# Altium footprint library CONN_B2B_FMC.PcbLib: 12 footprints (part 2 of 2)
Each footprint in its own frame and in the unit in brackets; x right, y up, seen from the top. Pads: shape width x height; smd on the part's side, far side on the other; paste and mask are expansions set on the pad; w line width, h text height; cw(c..) or ccw(c..) is an arc to the next point about the centre after c.
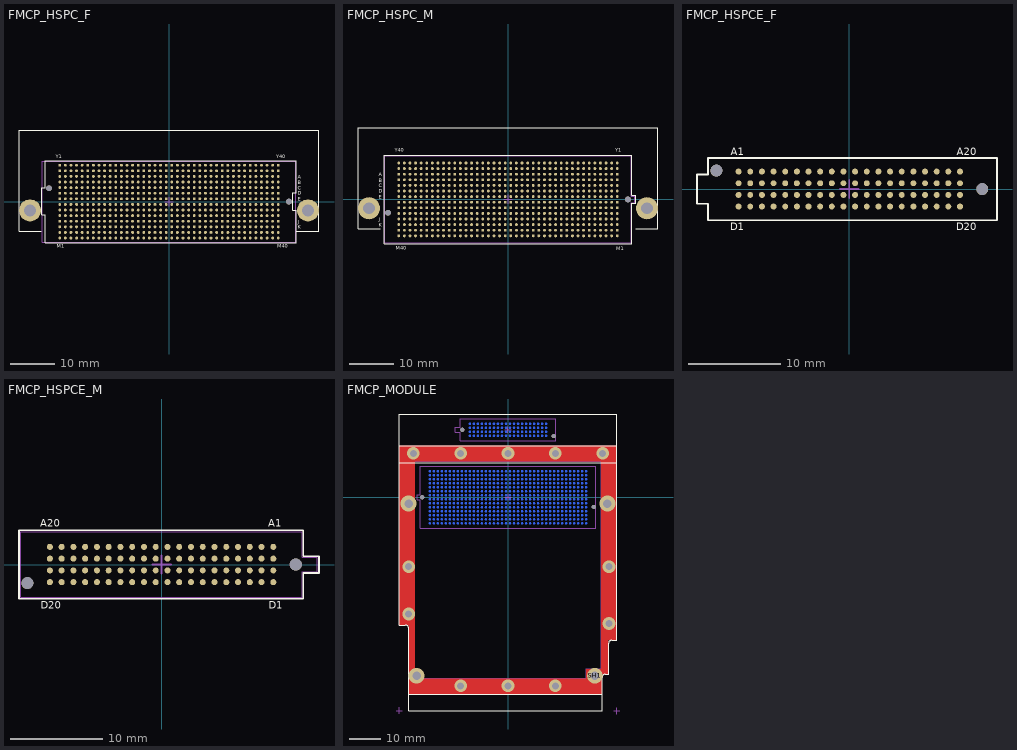
[diagram p1: the footprints below, top view; thin cyan lines are the x and y axes]

## FMCP_HSPC_F [mm] "FMC+ Carrier HSPC female, asp-184329"
height 10
pads (564):
  round 0.65 smd mask+0.075: A1(-24.765,5.715) A2(-23.495,5.715) A3(-22.225,5.715) A4(-20.955,5.715) A5(-19.685,5.715) A6(-18.415,5.715) A7(-17.145,5.715) A8(-15.875,5.715) A9(-14.605,5.715) A10(-13.335,5.715) A11(-12.065,5.715) A12(-10.795,5.715) A13(-9.525,5.715) A14(-8.255,5.715) A15(-6.985,5.715) A16(-5.715,5.715) A17(-4.445,5.715) A18(-3.175,5.715) A19(-1.905,5.715) A20(-0.635,5.715) A21(0.635,5.715) A22(1.905,5.715) A23(3.175,5.715) A24(4.445,5.715) A25(5.715,5.715) A26(6.985,5.715) A27(8.255,5.715) A28(9.525,5.715) A29(10.795,5.715) A30(12.065,5.715) A31(13.335,5.715) A32(14.605,5.715) A33(15.875,5.715) A34(17.145,5.715) A35(18.415,5.715) A36(19.685,5.715) A37(20.955,5.715) A38(22.225,5.715) A39(23.495,5.715) A40(24.765,5.715) B1(-24.765,4.445) B2(-23.495,4.445) B3(-22.225,4.445) B4(-20.955,4.445) B5(-19.685,4.445) B6(-18.415,4.445) B7(-17.145,4.445) B8(-15.875,4.445) B9(-14.605,4.445) B10(-13.335,4.445) B11(-12.065,4.445) B12(-10.795,4.445) B13(-9.525,4.445) B14(-8.255,4.445) B15(-6.985,4.445) B16(-5.715,4.445) B17(-4.445,4.445) B18(-3.175,4.445) B19(-1.905,4.445) B20(-0.635,4.445) B21(0.635,4.445) B22(1.905,4.445) B23(3.175,4.445) B24(4.445,4.445) B25(5.715,4.445) B26(6.985,4.445) B27(8.255,4.445) B28(9.525,4.445) B29(10.795,4.445) B30(12.065,4.445) B31(13.335,4.445) B32(14.605,4.445) B33(15.875,4.445) B34(17.145,4.445) B35(18.415,4.445) B36(19.685,4.445) B37(20.955,4.445) B38(22.225,4.445) B39(23.495,4.445) B40(24.765,4.445) C1(-24.765,3.175) C2(-23.495,3.175) C3(-22.225,3.175) C4(-20.955,3.175) C5(-19.685,3.175) C6(-18.415,3.175) C7(-17.145,3.175) C8(-15.875,3.175) C9(-14.605,3.175) C10(-13.335,3.175) C11(-12.065,3.175) C12(-10.795,3.175) C13(-9.525,3.175) C14(-8.255,3.175) C15(-6.985,3.175) C16(-5.715,3.175) C17(-4.445,3.175) C18(-3.175,3.175) C19(-1.905,3.175) C20(-0.635,3.175) C21(0.635,3.175) C22(1.905,3.175) C23(3.175,3.175) C24(4.445,3.175) C25(5.715,3.175) C26(6.985,3.175) C27(8.255,3.175) C28(9.525,3.175) C29(10.795,3.175) C30(12.065,3.175) C31(13.335,3.175) C32(14.605,3.175) C33(15.875,3.175) C34(17.145,3.175) C35(18.415,3.175) C36(19.685,3.175) C37(20.955,3.175) C38(22.225,3.175) C39(23.495,3.175) C40(24.765,3.175) D1(-24.765,1.905) D2(-23.495,1.905) D3(-22.225,1.905) D4(-20.955,1.905) D5(-19.685,1.905) D6(-18.415,1.905) D7(-17.145,1.905) D8(-15.875,1.905) D9(-14.605,1.905) D10(-13.335,1.905) D11(-12.065,1.905) D12(-10.795,1.905) D13(-9.525,1.905) D14(-8.255,1.905) D15(-6.985,1.905) D16(-5.715,1.905) D17(-4.445,1.905) D18(-3.175,1.905) D19(-1.905,1.905) D20(-0.635,1.905) D21(0.635,1.905) D22(1.905,1.905) D23(3.175,1.905) D24(4.445,1.905) D25(5.715,1.905) D26(6.985,1.905) D27(8.255,1.905) D28(9.525,1.905) D29(10.795,1.905) D30(12.065,1.905) D31(13.335,1.905) D32(14.605,1.905) D33(15.875,1.905) D34(17.145,1.905) D35(18.415,1.905) D36(19.685,1.905) D37(20.955,1.905) D38(22.225,1.905) D39(23.495,1.905) D40(24.765,1.905) E1(-24.765,0.635) E2(-23.495,0.635) E3(-22.225,0.635) E4(-20.955,0.635) E5(-19.685,0.635) E6(-18.415,0.635) E7(-17.145,0.635) E8(-15.875,0.635) E9(-14.605,0.635) E10(-13.335,0.635) E11(-12.065,0.635) E12(-10.795,0.635) E13(-9.525,0.635) E14(-8.255,0.635) E15(-6.985,0.635) E16(-5.715,0.635) E17(-4.445,0.635) E18(-3.175,0.635) E19(-1.905,0.635) E20(-0.635,0.635) E21(0.635,0.635) E22(1.905,0.635) E23(3.175,0.635) E24(4.445,0.635) E25(5.715,0.635) E26(6.985,0.635) E27(8.255,0.635) E28(9.525,0.635) E29(10.795,0.635) E30(12.065,0.635) E31(13.335,0.635) E32(14.605,0.635) E33(15.875,0.635) E34(17.145,0.635) E35(18.415,0.635) E36(19.685,0.635) E37(20.955,0.635) E38(22.225,0.635) E39(23.495,0.635) E40(24.765,0.635) F1(-24.765,-0.635) F2(-23.495,-0.635) F3(-22.225,-0.635) F4(-20.955,-0.635) F5(-19.685,-0.635) F6(-18.415,-0.635) F7(-17.145,-0.635) F8(-15.875,-0.635) F9(-14.605,-0.635) F10(-13.335,-0.635) F11(-12.065,-0.635) F12(-10.795,-0.635) F13(-9.525,-0.635) F14(-8.255,-0.635) F15(-6.985,-0.635) F16(-5.715,-0.635) F17(-4.445,-0.635) F18(-3.175,-0.635) F19(-1.905,-0.635) F20(-0.635,-0.635) F21(0.635,-0.635) F22(1.905,-0.635) F23(3.175,-0.635) F24(4.445,-0.635) F25(5.715,-0.635) F26(6.985,-0.635) F27(8.255,-0.635) F28(9.525,-0.635) F29(10.795,-0.635) F30(12.065,-0.635) F31(13.335,-0.635) F32(14.605,-0.635) F33(15.875,-0.635) F34(17.145,-0.635) F35(18.415,-0.635) F36(19.685,-0.635) F37(20.955,-0.635) F38(22.225,-0.635) F39(23.495,-0.635) F40(24.765,-0.635) G1(-24.765,-1.905) G2(-23.495,-1.905) G3(-22.225,-1.905) G4(-20.955,-1.905) G5(-19.685,-1.905) G6(-18.415,-1.905) G7(-17.145,-1.905) G8(-15.875,-1.905) G9(-14.605,-1.905) G10(-13.335,-1.905) G11(-12.065,-1.905) G12(-10.795,-1.905) G13(-9.525,-1.905) G14(-8.255,-1.905) G15(-6.985,-1.905) G16(-5.715,-1.905) G17(-4.445,-1.905) G18(-3.175,-1.905) G19(-1.905,-1.905) G20(-0.635,-1.905) G21(0.635,-1.905) G22(1.905,-1.905) G23(3.175,-1.905) G24(4.445,-1.905) G25(5.715,-1.905) G26(6.985,-1.905) G27(8.255,-1.905) G28(9.525,-1.905) G29(10.795,-1.905) G30(12.065,-1.905) G31(13.335,-1.905) G32(14.605,-1.905) G33(15.875,-1.905) G34(17.145,-1.905) G35(18.415,-1.905) G36(19.685,-1.905) G37(20.955,-1.905) G38(22.225,-1.905) G39(23.495,-1.905) G40(24.765,-1.905) H1(-24.765,-3.175) H2(-23.495,-3.175) H3(-22.225,-3.175) H4(-20.955,-3.175) H5(-19.685,-3.175) H6(-18.415,-3.175) H7(-17.145,-3.175) H8(-15.875,-3.175) H9(-14.605,-3.175) H10(-13.335,-3.175) H11(-12.065,-3.175) H12(-10.795,-3.175) H13(-9.525,-3.175) H14(-8.255,-3.175) H15(-6.985,-3.175) H16(-5.715,-3.175) H17(-4.445,-3.175) H18(-3.175,-3.175) H19(-1.905,-3.175) H20(-0.635,-3.175) H21(0.635,-3.175) H22(1.905,-3.175) H23(3.175,-3.175) H24(4.445,-3.175) H25(5.715,-3.175) H26(6.985,-3.175) H27(8.255,-3.175) H28(9.525,-3.175) H29(10.795,-3.175) H30(12.065,-3.175) H31(13.335,-3.175) H32(14.605,-3.175) H33(15.875,-3.175) H34(17.145,-3.175) H35(18.415,-3.175) H36(19.685,-3.175) H37(20.955,-3.175) H38(22.225,-3.175) H39(23.495,-3.175) H40(24.765,-3.175) J1(-24.765,-4.445) J2(-23.495,-4.445) J3(-22.225,-4.445) J4(-20.955,-4.445) J5(-19.685,-4.445) J6(-18.415,-4.445) J7(-17.145,-4.445) J8(-15.875,-4.445) J9(-14.605,-4.445) J10(-13.335,-4.445) J11(-12.065,-4.445) J12(-10.795,-4.445) J13(-9.525,-4.445) J14(-8.255,-4.445) J15(-6.985,-4.445) J16(-5.715,-4.445) J17(-4.445,-4.445) J18(-3.175,-4.445) J19(-1.905,-4.445) J20(-0.635,-4.445) J21(0.635,-4.445) J22(1.905,-4.445) J23(3.175,-4.445) J24(4.445,-4.445) J25(5.715,-4.445) J26(6.985,-4.445) J27(8.255,-4.445) J28(9.525,-4.445) J29(10.795,-4.445) J30(12.065,-4.445) J31(13.335,-4.445) J32(14.605,-4.445) J33(15.875,-4.445) J34(17.145,-4.445) J35(18.415,-4.445) J36(19.685,-4.445) J37(20.955,-4.445) J38(22.225,-4.445) J39(23.495,-4.445) J40(24.765,-4.445) K1(-24.765,-5.715) K2(-23.495,-5.715) K3(-22.225,-5.715) K4(-20.955,-5.715) K5(-19.685,-5.715) K6(-18.415,-5.715) K7(-17.145,-5.715) K8(-15.875,-5.715) K9(-14.605,-5.715) K10(-13.335,-5.715) K11(-12.065,-5.715) K12(-10.795,-5.715) K13(-9.525,-5.715) K14(-8.255,-5.715) K15(-6.985,-5.715) K16(-5.715,-5.715) K17(-4.445,-5.715) K18(-3.175,-5.715) K19(-1.905,-5.715) K20(-0.635,-5.715) K21(0.635,-5.715) K22(1.905,-5.715) K23(3.175,-5.715) K24(4.445,-5.715) K25(5.715,-5.715) K26(6.985,-5.715) K27(8.255,-5.715) K28(9.525,-5.715) K29(10.795,-5.715) K30(12.065,-5.715) K31(13.335,-5.715) K32(14.605,-5.715) K33(15.875,-5.715) K34(17.145,-5.715) K35(18.415,-5.715) K36(19.685,-5.715) K37(20.955,-5.715) K38(22.225,-5.715) K39(23.495,-5.715) K40(24.765,-5.715) L1(-24.765,-6.985) L2(-23.495,-6.985) L3(-22.225,-6.985) L4(-20.955,-6.985) L5(-19.685,-6.985) L6(-18.415,-6.985) L7(-17.145,-6.985) L8(-15.875,-6.985) L9(-14.605,-6.985) L10(-13.335,-6.985) L11(-12.065,-6.985) L12(-10.795,-6.985) L13(-9.525,-6.985) L14(-8.255,-6.985) L15(-6.985,-6.985) L16(-5.715,-6.985) L17(-4.445,-6.985) L18(-3.175,-6.985) L19(-1.905,-6.985) L20(-0.635,-6.985) L21(0.635,-6.985) L22(1.905,-6.985) L23(3.175,-6.985) L24(4.445,-6.985) L25(5.715,-6.985) L26(6.985,-6.985) L27(8.255,-6.985) L28(9.525,-6.985) L29(10.795,-6.985) L30(12.065,-6.985) L31(13.335,-6.985) L32(14.605,-6.985) L33(15.875,-6.985) L34(17.145,-6.985) L35(18.415,-6.985) L36(19.685,-6.985) L37(20.955,-6.985) L38(22.225,-6.985) L39(23.495,-6.985) L40(24.765,-6.985) M1(-24.765,-8.255) M2(-23.495,-8.255) M3(-22.225,-8.255) M4(-20.955,-8.255) M5(-19.685,-8.255) M6(-18.415,-8.255) M7(-17.145,-8.255) M8(-15.875,-8.255) M9(-14.605,-8.255) M10(-13.335,-8.255) M11(-12.065,-8.255) M12(-10.795,-8.255) M13(-9.525,-8.255) M14(-8.255,-8.255) M15(-6.985,-8.255) M16(-5.715,-8.255) M17(-4.445,-8.255) M18(-3.175,-8.255) M19(-1.905,-8.255) M20(-0.635,-8.255) M21(0.635,-8.255) M22(1.905,-8.255) M23(3.175,-8.255) M24(4.445,-8.255) M25(5.715,-8.255) M26(6.985,-8.255) M27(8.255,-8.255) M28(9.525,-8.255) M29(10.795,-8.255) M30(12.065,-8.255) M31(13.335,-8.255) M32(14.605,-8.255) M33(15.875,-8.255) M34(17.145,-8.255) M35(18.415,-8.255) M36(19.685,-8.255) M37(20.955,-8.255) M38(22.225,-8.255) M39(23.495,-8.255) M40(24.765,-8.255) Y1(-24.765,8.255) Y2(-23.495,8.255) Y3(-22.225,8.255) Y4(-20.955,8.255) Y5(-19.685,8.255) Y6(-18.415,8.255) Y7(-17.145,8.255) Y8(-15.875,8.255) Y9(-14.605,8.255) Y10(-13.335,8.255) Y11(-12.065,8.255) Y12(-10.795,8.255) Y13(-9.525,8.255) Y14(-8.255,8.255) Y15(-6.985,8.255) Y16(-5.715,8.255) Y17(-4.445,8.255) Y18(-3.175,8.255) Y19(-1.905,8.255) Y20(-0.635,8.255) Y21(0.635,8.255) Y22(1.905,8.255) Y23(3.175,8.255) Y24(4.445,8.255) Y25(5.715,8.255) Y26(6.985,8.255) Y27(8.255,8.255) Y28(9.525,8.255) Y29(10.795,8.255) Y30(12.065,8.255) Y31(13.335,8.255) Y32(14.605,8.255) Y33(15.875,8.255) Y34(17.145,8.255) Y35(18.415,8.255) Y36(19.685,8.255) Y37(20.955,8.255) Y38(22.225,8.255) Y39(23.495,8.255) Y40(24.765,8.255) Z1(-24.765,6.985) Z2(-23.495,6.985) Z3(-22.225,6.985) Z4(-20.955,6.985) Z5(-19.685,6.985) Z6(-18.415,6.985) Z7(-17.145,6.985) Z8(-15.875,6.985) Z9(-14.605,6.985) Z10(-13.335,6.985) Z11(-12.065,6.985) Z12(-10.795,6.985) Z13(-9.525,6.985) Z14(-8.255,6.985) Z15(-6.985,6.985) Z16(-5.715,6.985) Z17(-4.445,6.985) Z18(-3.175,6.985) Z19(-1.905,6.985) Z20(-0.635,6.985) Z21(0.635,6.985) Z22(1.905,6.985) Z23(3.175,6.985) Z24(4.445,6.985) Z25(5.715,6.985) Z26(6.985,6.985) Z27(8.255,6.985) Z28(9.525,6.985) Z29(10.795,6.985) Z30(12.065,6.985) Z31(13.335,6.985) Z32(14.605,6.985) Z33(15.875,6.985) Z34(17.145,6.985) Z35(18.415,6.985) Z36(19.685,6.985) Z37(20.955,6.985) Z38(22.225,6.985) Z39(23.495,6.985) Z40(24.765,6.985)
  round 5 hole 2.7: ""(-31.5,-2) ""(31.5,-2)
  round 1.3 hole 1.3 unplated: ""(-27.191,3.048) ""(27.191,0)
Top Overlay:
  lines w0.2: -29,-6.7 -34,-6.7 -34,16.2 34,16.2 34,-6.7 29,-6.7 ; -28.8,-3 -28,-3 -28,-9.3 28.8,-9.3 28.8,-2 28,-2 28,2 28.8,2 28.8,9.3 -28,9.3 -28,3.1 -28.1,3.1 -28.8,3.1 -28.8,-3
  text "M40" at 24.552,-10.482 h0.8
  text "Y40" at 24.267,9.781 h0.8
  text "M1" at -25.489,-10.456 h0.8
  text "Y1" at -25.727,9.792 h0.8
  text "K" at 29.2,-6.2 h0.8
  text "J" at 29.2,-5 h0.8
  text "E" at 29.2,0.2 h0.8
  text "D" at 29.2,1.5 h0.8
  text "C" at 29.2,2.7 h0.8
  text "B" at 29.2,3.9 h0.8
  text "A" at 29.2,5.2 h0.8
Mechanical 1:
  lines w0.2: -1,0 1,0 ; 0,-1 0,1
Mechanical 15:
  lines w0.1: -28.7,-9.2 -28.7,9.2 28.7,9.2 28.7,-9.2 -28.7,-9.2
3D body "asp-184329-01_socket.step": height 6.48, standoff -1.35, extent -28.728,-9.184 28.727,9.183

## FMCP_HSPC_M [mm] "FMC+ Module HSPC male, asp-184330"
height 10
pads (564):
  round 0.65 smd mask+0.075: A1(24.765,5.715) A2(23.495,5.715) A3(22.225,5.715) A4(20.955,5.715) A5(19.685,5.715) A6(18.415,5.715) A7(17.145,5.715) A8(15.875,5.715) A9(14.605,5.715) A10(13.335,5.715) A11(12.065,5.715) A12(10.795,5.715) A13(9.525,5.715) A14(8.255,5.715) A15(6.985,5.715) A16(5.715,5.715) A17(4.445,5.715) A18(3.175,5.715) A19(1.905,5.715) A20(0.635,5.715) A21(-0.635,5.715) A22(-1.905,5.715) A23(-3.175,5.715) A24(-4.445,5.715) A25(-5.715,5.715) A26(-6.985,5.715) A27(-8.255,5.715) A28(-9.525,5.715) A29(-10.795,5.715) A30(-12.065,5.715) A31(-13.335,5.715) A32(-14.605,5.715) A33(-15.875,5.715) A34(-17.145,5.715) A35(-18.415,5.715) A36(-19.685,5.715) A37(-20.955,5.715) A38(-22.225,5.715) A39(-23.495,5.715) A40(-24.765,5.715) B1(24.765,4.445) B2(23.495,4.445) B3(22.225,4.445) B4(20.955,4.445) B5(19.685,4.445) B6(18.415,4.445) B7(17.145,4.445) B8(15.875,4.445) B9(14.605,4.445) B10(13.335,4.445) B11(12.065,4.445) B12(10.795,4.445) B13(9.525,4.445) B14(8.255,4.445) B15(6.985,4.445) B16(5.715,4.445) B17(4.445,4.445) B18(3.175,4.445) B19(1.905,4.445) B20(0.635,4.445) B21(-0.635,4.445) B22(-1.905,4.445) B23(-3.175,4.445) B24(-4.445,4.445) B25(-5.715,4.445) B26(-6.985,4.445) B27(-8.255,4.445) B28(-9.525,4.445) B29(-10.795,4.445) B30(-12.065,4.445) B31(-13.335,4.445) B32(-14.605,4.445) B33(-15.875,4.445) B34(-17.145,4.445) B35(-18.415,4.445) B36(-19.685,4.445) B37(-20.955,4.445) B38(-22.225,4.445) B39(-23.495,4.445) B40(-24.765,4.445) C1(24.765,3.175) C2(23.495,3.175) C3(22.225,3.175) C4(20.955,3.175) C5(19.685,3.175) C6(18.415,3.175) C7(17.145,3.175) C8(15.875,3.175) C9(14.605,3.175) C10(13.335,3.175) C11(12.065,3.175) C12(10.795,3.175) C13(9.525,3.175) C14(8.255,3.175) C15(6.985,3.175) C16(5.715,3.175) C17(4.445,3.175) C18(3.175,3.175) C19(1.905,3.175) C20(0.635,3.175) C21(-0.635,3.175) C22(-1.905,3.175) C23(-3.175,3.175) C24(-4.445,3.175) C25(-5.715,3.175) C26(-6.985,3.175) C27(-8.255,3.175) C28(-9.525,3.175) C29(-10.795,3.175) C30(-12.065,3.175) C31(-13.335,3.175) C32(-14.605,3.175) C33(-15.875,3.175) C34(-17.145,3.175) C35(-18.415,3.175) C36(-19.685,3.175) C37(-20.955,3.175) C38(-22.225,3.175) C39(-23.495,3.175) C40(-24.765,3.175) D1(24.765,1.905) D2(23.495,1.905) D3(22.225,1.905) D4(20.955,1.905) D5(19.685,1.905) D6(18.415,1.905) D7(17.145,1.905) D8(15.875,1.905) D9(14.605,1.905) D10(13.335,1.905) D11(12.065,1.905) D12(10.795,1.905) D13(9.525,1.905) D14(8.255,1.905) D15(6.985,1.905) D16(5.715,1.905) D17(4.445,1.905) D18(3.175,1.905) D19(1.905,1.905) D20(0.635,1.905) D21(-0.635,1.905) D22(-1.905,1.905) D23(-3.175,1.905) D24(-4.445,1.905) D25(-5.715,1.905) D26(-6.985,1.905) D27(-8.255,1.905) D28(-9.525,1.905) D29(-10.795,1.905) D30(-12.065,1.905) D31(-13.335,1.905) D32(-14.605,1.905) D33(-15.875,1.905) D34(-17.145,1.905) D35(-18.415,1.905) D36(-19.685,1.905) D37(-20.955,1.905) D38(-22.225,1.905) D39(-23.495,1.905) D40(-24.765,1.905) E1(24.765,0.635) E2(23.495,0.635) E3(22.225,0.635) E4(20.955,0.635) E5(19.685,0.635) E6(18.415,0.635) E7(17.145,0.635) E8(15.875,0.635) E9(14.605,0.635) E10(13.335,0.635) E11(12.065,0.635) E12(10.795,0.635) E13(9.525,0.635) E14(8.255,0.635) E15(6.985,0.635) E16(5.715,0.635) E17(4.445,0.635) E18(3.175,0.635) E19(1.905,0.635) E20(0.635,0.635) E21(-0.635,0.635) E22(-1.905,0.635) E23(-3.175,0.635) E24(-4.445,0.635) E25(-5.715,0.635) E26(-6.985,0.635) E27(-8.255,0.635) E28(-9.525,0.635) E29(-10.795,0.635) E30(-12.065,0.635) E31(-13.335,0.635) E32(-14.605,0.635) E33(-15.875,0.635) E34(-17.145,0.635) E35(-18.415,0.635) E36(-19.685,0.635) E37(-20.955,0.635) E38(-22.225,0.635) E39(-23.495,0.635) E40(-24.765,0.635) F1(24.765,-0.635) F2(23.495,-0.635) F3(22.225,-0.635) F4(20.955,-0.635) F5(19.685,-0.635) F6(18.415,-0.635) F7(17.145,-0.635) F8(15.875,-0.635) F9(14.605,-0.635) F10(13.335,-0.635) F11(12.065,-0.635) F12(10.795,-0.635) F13(9.525,-0.635) F14(8.255,-0.635) F15(6.985,-0.635) F16(5.715,-0.635) F17(4.445,-0.635) F18(3.175,-0.635) F19(1.905,-0.635) F20(0.635,-0.635) F21(-0.635,-0.635) F22(-1.905,-0.635) F23(-3.175,-0.635) F24(-4.445,-0.635) F25(-5.715,-0.635) F26(-6.985,-0.635) F27(-8.255,-0.635) F28(-9.525,-0.635) F29(-10.795,-0.635) F30(-12.065,-0.635) F31(-13.335,-0.635) F32(-14.605,-0.635) F33(-15.875,-0.635) F34(-17.145,-0.635) F35(-18.415,-0.635) F36(-19.685,-0.635) F37(-20.955,-0.635) F38(-22.225,-0.635) F39(-23.495,-0.635) F40(-24.765,-0.635) G1(24.765,-1.905) G2(23.495,-1.905) G3(22.225,-1.905) G4(20.955,-1.905) G5(19.685,-1.905) G6(18.415,-1.905) G7(17.145,-1.905) G8(15.875,-1.905) G9(14.605,-1.905) G10(13.335,-1.905) G11(12.065,-1.905) G12(10.795,-1.905) G13(9.525,-1.905) G14(8.255,-1.905) G15(6.985,-1.905) G16(5.715,-1.905) G17(4.445,-1.905) G18(3.175,-1.905) G19(1.905,-1.905) G20(0.635,-1.905) G21(-0.635,-1.905) G22(-1.905,-1.905) G23(-3.175,-1.905) G24(-4.445,-1.905) G25(-5.715,-1.905) G26(-6.985,-1.905) G27(-8.255,-1.905) G28(-9.525,-1.905) G29(-10.795,-1.905) G30(-12.065,-1.905) G31(-13.335,-1.905) G32(-14.605,-1.905) G33(-15.875,-1.905) G34(-17.145,-1.905) G35(-18.415,-1.905) G36(-19.685,-1.905) G37(-20.955,-1.905) G38(-22.225,-1.905) G39(-23.495,-1.905) G40(-24.765,-1.905) H1(24.765,-3.175) H2(23.495,-3.175) H3(22.225,-3.175) H4(20.955,-3.175) H5(19.685,-3.175) H6(18.415,-3.175) H7(17.145,-3.175) H8(15.875,-3.175) H9(14.605,-3.175) H10(13.335,-3.175) H11(12.065,-3.175) H12(10.795,-3.175) H13(9.525,-3.175) H14(8.255,-3.175) H15(6.985,-3.175) H16(5.715,-3.175) H17(4.445,-3.175) H18(3.175,-3.175) H19(1.905,-3.175) H20(0.635,-3.175) H21(-0.635,-3.175) H22(-1.905,-3.175) H23(-3.175,-3.175) H24(-4.445,-3.175) H25(-5.715,-3.175) H26(-6.985,-3.175) H27(-8.255,-3.175) H28(-9.525,-3.175) H29(-10.795,-3.175) H30(-12.065,-3.175) H31(-13.335,-3.175) H32(-14.605,-3.175) H33(-15.875,-3.175) H34(-17.145,-3.175) H35(-18.415,-3.175) H36(-19.685,-3.175) H37(-20.955,-3.175) H38(-22.225,-3.175) H39(-23.495,-3.175) H40(-24.765,-3.175) J1(24.765,-4.445) J2(23.495,-4.445) J3(22.225,-4.445) J4(20.955,-4.445) J5(19.685,-4.445) J6(18.415,-4.445) J7(17.145,-4.445) J8(15.875,-4.445) J9(14.605,-4.445) J10(13.335,-4.445) J11(12.065,-4.445) J12(10.795,-4.445) J13(9.525,-4.445) J14(8.255,-4.445) J15(6.985,-4.445) J16(5.715,-4.445) J17(4.445,-4.445) J18(3.175,-4.445) J19(1.905,-4.445) J20(0.635,-4.445) J21(-0.635,-4.445) J22(-1.905,-4.445) J23(-3.175,-4.445) J24(-4.445,-4.445) J25(-5.715,-4.445) J26(-6.985,-4.445) J27(-8.255,-4.445) J28(-9.525,-4.445) J29(-10.795,-4.445) J30(-12.065,-4.445) J31(-13.335,-4.445) J32(-14.605,-4.445) J33(-15.875,-4.445) J34(-17.145,-4.445) J35(-18.415,-4.445) J36(-19.685,-4.445) J37(-20.955,-4.445) J38(-22.225,-4.445) J39(-23.495,-4.445) J40(-24.765,-4.445) K1(24.765,-5.715) K2(23.495,-5.715) K3(22.225,-5.715) K4(20.955,-5.715) K5(19.685,-5.715) K6(18.415,-5.715) K7(17.145,-5.715) K8(15.875,-5.715) K9(14.605,-5.715) K10(13.335,-5.715) K11(12.065,-5.715) K12(10.795,-5.715) K13(9.525,-5.715) K14(8.255,-5.715) K15(6.985,-5.715) K16(5.715,-5.715) K17(4.445,-5.715) K18(3.175,-5.715) K19(1.905,-5.715) K20(0.635,-5.715) K21(-0.635,-5.715) K22(-1.905,-5.715) K23(-3.175,-5.715) K24(-4.445,-5.715) K25(-5.715,-5.715) K26(-6.985,-5.715) K27(-8.255,-5.715) K28(-9.525,-5.715) K29(-10.795,-5.715) K30(-12.065,-5.715) K31(-13.335,-5.715) K32(-14.605,-5.715) K33(-15.875,-5.715) K34(-17.145,-5.715) K35(-18.415,-5.715) K36(-19.685,-5.715) K37(-20.955,-5.715) K38(-22.225,-5.715) K39(-23.495,-5.715) K40(-24.765,-5.715) L1(24.765,-6.985) L2(23.495,-6.985) L3(22.225,-6.985) L4(20.955,-6.985) L5(19.685,-6.985) L6(18.415,-6.985) L7(17.145,-6.985) L8(15.875,-6.985) L9(14.605,-6.985) L10(13.335,-6.985) L11(12.065,-6.985) L12(10.795,-6.985) L13(9.525,-6.985) L14(8.255,-6.985) L15(6.985,-6.985) L16(5.715,-6.985) L17(4.445,-6.985) L18(3.175,-6.985) L19(1.905,-6.985) L20(0.635,-6.985) L21(-0.635,-6.985) L22(-1.905,-6.985) L23(-3.175,-6.985) L24(-4.445,-6.985) L25(-5.715,-6.985) L26(-6.985,-6.985) L27(-8.255,-6.985) L28(-9.525,-6.985) L29(-10.795,-6.985) L30(-12.065,-6.985) L31(-13.335,-6.985) L32(-14.605,-6.985) L33(-15.875,-6.985) L34(-17.145,-6.985) L35(-18.415,-6.985) L36(-19.685,-6.985) L37(-20.955,-6.985) L38(-22.225,-6.985) L39(-23.495,-6.985) L40(-24.765,-6.985) M1(24.765,-8.255) M2(23.495,-8.255) M3(22.225,-8.255) M4(20.955,-8.255) M5(19.685,-8.255) M6(18.415,-8.255) M7(17.145,-8.255) M8(15.875,-8.255) M9(14.605,-8.255) M10(13.335,-8.255) M11(12.065,-8.255) M12(10.795,-8.255) M13(9.525,-8.255) M14(8.255,-8.255) M15(6.985,-8.255) M16(5.715,-8.255) M17(4.445,-8.255) M18(3.175,-8.255) M19(1.905,-8.255) M20(0.635,-8.255) M21(-0.635,-8.255) M22(-1.905,-8.255) M23(-3.175,-8.255) M24(-4.445,-8.255) M25(-5.715,-8.255) M26(-6.985,-8.255) M27(-8.255,-8.255) M28(-9.525,-8.255) M29(-10.795,-8.255) M30(-12.065,-8.255) M31(-13.335,-8.255) M32(-14.605,-8.255) M33(-15.875,-8.255) M34(-17.145,-8.255) M35(-18.415,-8.255) M36(-19.685,-8.255) M37(-20.955,-8.255) M38(-22.225,-8.255) M39(-23.495,-8.255) M40(-24.765,-8.255) Y1(24.765,8.255) Y2(23.495,8.255) Y3(22.225,8.255) Y4(20.955,8.255) Y5(19.685,8.255) Y6(18.415,8.255) Y7(17.145,8.255) Y8(15.875,8.255) Y9(14.605,8.255) Y10(13.335,8.255) Y11(12.065,8.255) Y12(10.795,8.255) Y13(9.525,8.255) Y14(8.255,8.255) Y15(6.985,8.255) Y16(5.715,8.255) Y17(4.445,8.255) Y18(3.175,8.255) Y19(1.905,8.255) Y20(0.635,8.255) Y21(-0.635,8.255) Y22(-1.905,8.255) Y23(-3.175,8.255) Y24(-4.445,8.255) Y25(-5.715,8.255) Y26(-6.985,8.255) Y27(-8.255,8.255) Y28(-9.525,8.255) Y29(-10.795,8.255) Y30(-12.065,8.255) Y31(-13.335,8.255) Y32(-14.605,8.255) Y33(-15.875,8.255) Y34(-17.145,8.255) Y35(-18.415,8.255) Y36(-19.685,8.255) Y37(-20.955,8.255) Y38(-22.225,8.255) Y39(-23.495,8.255) Y40(-24.765,8.255) Z1(24.765,6.985) Z2(23.495,6.985) Z3(22.225,6.985) Z4(20.955,6.985) Z5(19.685,6.985) Z6(18.415,6.985) Z7(17.145,6.985) Z8(15.875,6.985) Z9(14.605,6.985) Z10(13.335,6.985) Z11(12.065,6.985) Z12(10.795,6.985) Z13(9.525,6.985) Z14(8.255,6.985) Z15(6.985,6.985) Z16(5.715,6.985) Z17(4.445,6.985) Z18(3.175,6.985) Z19(1.905,6.985) Z20(0.635,6.985) Z21(-0.635,6.985) Z22(-1.905,6.985) Z23(-3.175,6.985) Z24(-4.445,6.985) Z25(-5.715,6.985) Z26(-6.985,6.985) Z27(-8.255,6.985) Z28(-9.525,6.985) Z29(-10.795,6.985) Z30(-12.065,6.985) Z31(-13.335,6.985) Z32(-14.605,6.985) Z33(-15.875,6.985) Z34(-17.145,6.985) Z35(-18.415,6.985) Z36(-19.685,6.985) Z37(-20.955,6.985) Z38(-22.225,6.985) Z39(-23.495,6.985) Z40(-24.765,6.985)
  round 5 hole 2.7: ""(-31.5,-2) ""(31.5,-2)
  round 1.3 hole 1.3 unplated: ""(-27.191,-3.048) ""(27.191,0)
Top Overlay:
  lines w0.2: -29,-6.7 -34,-6.7 -34,16.2 34,16.2 34,-6.7 29,-6.7 ; -28,-10 -28,10 28,10 28,0.9 28.9,0.9 28.9,-0.9 28,-0.9 28,-10 -28,-10
  text "M1" at 24.552,-11.482 h0.8
  text "Y1" at 24.267,10.781 h0.8
  text "M40" at -25.489,-11.456 h0.8
  text "Y40" at -25.727,10.792 h0.8
  text "K" at -29.3,-6.2 h0.8
  text "J" at -29.3,-5 h0.8
  text "E" at -29.3,0.2 h0.8
  text "D" at -29.3,1.5 h0.8
  text "C" at -29.3,2.7 h0.8
  text "B" at -29.3,3.9 h0.8
  text "A" at -29.3,5.2 h0.8
Mechanical 1:
  lines w0.2: -1,0 1,0 ; 0,-1 0,1
Mechanical 15:
  lines w0.1: -27.889,-9.881 -27.889,9.881 27.889,9.881 27.889,0.762 28.778,0.762 28.778,-0.762 27.889,-0.762 27.889,-9.881 -27.889,-9.881
3D body "asp-184330-01.step": height 7.03, standoff -1.35, extent -27.889,-9.881 28.778,9.88

## FMCP_HSPCE_F [mm] "FMC+ Carrier HSPCe male, ASP-186899"
height 10
pads (82):
  round 0.65 smd mask+0.075: A1(-12.065,1.905) A2(-10.795,1.905) A3(-9.525,1.905) A4(-8.255,1.905) A5(-6.985,1.905) A6(-5.715,1.905) A7(-4.445,1.905) A8(-3.175,1.905) A9(-1.905,1.905) A10(-0.635,1.905) A11(0.635,1.905) A12(1.905,1.905) A13(3.175,1.905) A14(4.445,1.905) A15(5.715,1.905) A16(6.985,1.905) A17(8.255,1.905) A18(9.525,1.905) A19(10.795,1.905) A20(12.065,1.905) B1(-12.065,0.635) B2(-10.795,0.635) B3(-9.525,0.635) B4(-8.255,0.635) B5(-6.985,0.635) B6(-5.715,0.635) B7(-4.445,0.635) B8(-3.175,0.635) B9(-1.905,0.635) B10(-0.635,0.635) B11(0.635,0.635) B12(1.905,0.635) B13(3.175,0.635) B14(4.445,0.635) B15(5.715,0.635) B16(6.985,0.635) B17(8.255,0.635) B18(9.525,0.635) B19(10.795,0.635) B20(12.065,0.635) C1(-12.065,-0.635) C2(-10.795,-0.635) C3(-9.525,-0.635) C4(-8.255,-0.635) C5(-6.985,-0.635) C6(-5.715,-0.635) C7(-4.445,-0.635) C8(-3.175,-0.635) C9(-1.905,-0.635) C10(-0.635,-0.635) C11(0.635,-0.635) C12(1.905,-0.635) C13(3.175,-0.635) C14(4.445,-0.635) C15(5.715,-0.635) C16(6.985,-0.635) C17(8.255,-0.635) C18(9.525,-0.635) C19(10.795,-0.635) C20(12.065,-0.635) D1(-12.065,-1.905) D2(-10.795,-1.905) D3(-9.525,-1.905) D4(-8.255,-1.905) D5(-6.985,-1.905) D6(-5.715,-1.905) D7(-4.445,-1.905) D8(-3.175,-1.905) D9(-1.905,-1.905) D10(-0.635,-1.905) D11(0.635,-1.905) D12(1.905,-1.905) D13(3.175,-1.905) D14(4.445,-1.905) D15(5.715,-1.905) D16(6.985,-1.905) D17(8.255,-1.905) D18(9.525,-1.905) D19(10.795,-1.905) D20(12.065,-1.905)
  round 1.3 hole 1.3 unplated: ""(-14.491,2.007) ""(14.491,0)
Top Overlay:
  lines w0.2: -16.6,-1.6 -15.4,-1.6 -15.4,-3.4 16.1,-3.4 16.1,3.4 -15.4,3.4 -15.4,1.6 -16.6,1.6 -16.6,-1.6
  text "D1" at -12.959,-4.483 h0.8
  text "A1" at -12.919,3.696 h0.8
  text "A20" at 11.713,3.696 h0.8
  text "D20" at 11.674,-4.483 h0.8
Mechanical 1:
  lines w0.2: -1,0 1,0 ; 0,-1 0,1
3D body "asp-186899-01_hspce_socket .step": height 6.6, standoff -1.35, extent -16.536,-3.251 16.027,3.251

## FMCP_HSPCE_M [mm] "FMC+ Module HSPCe male, ASP-186900"
height 10
pads (82):
  round 0.65 smd mask+0.075: A1(12.065,1.905) A2(10.795,1.905) A3(9.525,1.905) A4(8.255,1.905) A5(6.985,1.905) A6(5.715,1.905) A7(4.445,1.905) A8(3.175,1.905) A9(1.905,1.905) A10(0.635,1.905) A11(-0.635,1.905) A12(-1.905,1.905) A13(-3.175,1.905) A14(-4.445,1.905) A15(-5.715,1.905) A16(-6.985,1.905) A17(-8.255,1.905) A18(-9.525,1.905) A19(-10.795,1.905) A20(-12.065,1.905) B1(12.065,0.635) B2(10.795,0.635) B3(9.525,0.635) B4(8.255,0.635) B5(6.985,0.635) B6(5.715,0.635) B7(4.445,0.635) B8(3.175,0.635) B9(1.905,0.635) B10(0.635,0.635) B11(-0.635,0.635) B12(-1.905,0.635) B13(-3.175,0.635) B14(-4.445,0.635) B15(-5.715,0.635) B16(-6.985,0.635) B17(-8.255,0.635) B18(-9.525,0.635) B19(-10.795,0.635) B20(-12.065,0.635) C1(12.065,-0.635) C2(10.795,-0.635) C3(9.525,-0.635) C4(8.255,-0.635) C5(6.985,-0.635) C6(5.715,-0.635) C7(4.445,-0.635) C8(3.175,-0.635) C9(1.905,-0.635) C10(0.635,-0.635) C11(-0.635,-0.635) C12(-1.905,-0.635) C13(-3.175,-0.635) C14(-4.445,-0.635) C15(-5.715,-0.635) C16(-6.985,-0.635) C17(-8.255,-0.635) C18(-9.525,-0.635) C19(-10.795,-0.635) C20(-12.065,-0.635) D1(12.065,-1.905) D2(10.795,-1.905) D3(9.525,-1.905) D4(8.255,-1.905) D5(6.985,-1.905) D6(5.715,-1.905) D7(4.445,-1.905) D8(3.175,-1.905) D9(1.905,-1.905) D10(0.635,-1.905) D11(-0.635,-1.905) D12(-1.905,-1.905) D13(-3.175,-1.905) D14(-4.445,-1.905) D15(-5.715,-1.905) D16(-6.985,-1.905) D17(-8.255,-1.905) D18(-9.525,-1.905) D19(-10.795,-1.905) D20(-12.065,-1.905)
  round 1.3 hole 1.3 unplated: ""(-14.491,-2.007) ""(14.491,0)
Top Overlay:
  lines w0.2: -15.4,-3.7 -15.4,3.7 15.3,3.7 15.3,0.9 17,0.9 17,-0.9 15.3,-0.9 15.3,-3.7 -15.4,-3.7
  text "D1" at 11.559,-4.783 h0.8
  text "A1" at 11.519,4.096 h0.8
  text "A20" at -13.113,4.096 h0.8
  text "D20" at -13.074,-4.783 h0.8
Mechanical 1:
  lines w0.2: -1,0 1,0 ; 0,-1 0,1
Mechanical 15:
  lines w0.1: -15.189,-3.531 -15.189,3.531 15.189,3.531 15.189,0.762 16.789,0.762 16.789,-0.762 15.189,-0.762 15.189,-3.531 -15.189,-3.531
3D body "asp-186900-01_hspce.step": height 6.53, standoff -1.86, extent -15.189,-3.531 16.789,3.53

## FMCP_MODULE [mm] "ASP-184330-01"
height 1.2
pads (645):
  round 0.65 smd far side mask+0.075: A1(-24.765,5.715) A1(-12.065,23.305) A2(-23.495,5.715) A2(-10.795,23.305) A3(-22.225,5.715) A3(-9.525,23.305) A4(-20.955,5.715) A4(-8.255,23.305) A5(-19.685,5.715) A5(-6.985,23.305) A6(-18.415,5.715) A6(-5.715,23.305) A7(-17.145,5.715) A7(-4.445,23.305) A8(-15.875,5.715) A8(-3.175,23.305) A9(-14.605,5.715) A9(-1.905,23.305) A10(-13.335,5.715) A10(-0.635,23.305) A11(-12.065,5.715) A11(0.635,23.305) A12(-10.795,5.715) A12(1.905,23.305) A13(-9.525,5.715) A13(3.175,23.305) A14(-8.255,5.715) A14(4.445,23.305) A15(-6.985,5.715) A15(5.715,23.305) A16(-5.715,5.715) A16(6.985,23.305) A17(-4.445,5.715) A17(8.255,23.305) A18(-3.175,5.715) A18(9.525,23.305) A19(-1.905,5.715) A19(10.795,23.305) A20(-0.635,5.715) A20(12.065,23.305) A21(0.635,5.715) A22(1.905,5.715) A23(3.175,5.715) A24(4.445,5.715) A25(5.715,5.715) A26(6.985,5.715) A27(8.255,5.715) A28(9.525,5.715) A29(10.795,5.715) A30(12.065,5.715) A31(13.335,5.715) A32(14.605,5.715) A33(15.875,5.715) A34(17.145,5.715) A35(18.415,5.715) A36(19.685,5.715) A37(20.955,5.715) A38(22.225,5.715) A39(23.495,5.715) A40(24.765,5.715) B1(-24.765,4.445) B1(-12.065,22.035) B2(-23.495,4.445) B2(-10.795,22.035) B3(-22.225,4.445) B3(-9.525,22.035) B4(-20.955,4.445) B4(-8.255,22.035) B5(-19.685,4.445) B5(-6.985,22.035) B6(-18.415,4.445) B6(-5.715,22.035) B7(-17.145,4.445) B7(-4.445,22.035) B8(-15.875,4.445) B8(-3.175,22.035) B9(-14.605,4.445) B9(-1.905,22.035) B10(-13.335,4.445) B10(-0.635,22.035) B11(-12.065,4.445) B11(0.635,22.035) B12(-10.795,4.445) B12(1.905,22.035) B13(-9.525,4.445) B13(3.175,22.035) B14(-8.255,4.445) B14(4.445,22.035) B15(-6.985,4.445) B15(5.715,22.035) B16(-5.715,4.445) B16(6.985,22.035) B17(-4.445,4.445) B17(8.255,22.035) B18(-3.175,4.445) B18(9.525,22.035) B19(-1.905,4.445) B19(10.795,22.035) B20(-0.635,4.445) B20(12.065,22.035) B21(0.635,4.445) B22(1.905,4.445) B23(3.175,4.445) B24(4.445,4.445) B25(5.715,4.445) B26(6.985,4.445) B27(8.255,4.445) B28(9.525,4.445) B29(10.795,4.445) B30(12.065,4.445) B31(13.335,4.445) B32(14.605,4.445) B33(15.875,4.445) B34(17.145,4.445) B35(18.415,4.445) B36(19.685,4.445) B37(20.955,4.445) B38(22.225,4.445) B39(23.495,4.445) B40(24.765,4.445) C1(-24.765,3.175) C1(-12.065,20.765) C2(-23.495,3.175) C2(-10.795,20.765) C3(-22.225,3.175) C3(-9.525,20.765) C4(-20.955,3.175) C4(-8.255,20.765) C5(-19.685,3.175) C5(-6.985,20.765) C6(-18.415,3.175) C6(-5.715,20.765) C7(-17.145,3.175) C7(-4.445,20.765) C8(-15.875,3.175) C8(-3.175,20.765) C9(-14.605,3.175) C9(-1.905,20.765) C10(-13.335,3.175) C10(-0.635,20.765) C11(-12.065,3.175) C11(0.635,20.765) C12(-10.795,3.175) C12(1.905,20.765) C13(-9.525,3.175) C13(3.175,20.765) C14(-8.255,3.175) C14(4.445,20.765) C15(-6.985,3.175) C15(5.715,20.765) C16(-5.715,3.175) C16(6.985,20.765) C17(-4.445,3.175) C17(8.255,20.765) C18(-3.175,3.175) C18(9.525,20.765) C19(-1.905,3.175) C19(10.795,20.765) C20(-0.635,3.175) C20(12.065,20.765) C21(0.635,3.175) C22(1.905,3.175) C23(3.175,3.175) C24(4.445,3.175) C25(5.715,3.175) C26(6.985,3.175) C27(8.255,3.175) C28(9.525,3.175) C29(10.795,3.175) C30(12.065,3.175) C31(13.335,3.175) C32(14.605,3.175) C33(15.875,3.175) C34(17.145,3.175) C35(18.415,3.175) C36(19.685,3.175) C37(20.955,3.175) C38(22.225,3.175) C39(23.495,3.175) C40(24.765,3.175) D1(-24.765,1.905) D1(-12.065,19.495) D2(-23.495,1.905) D2(-10.795,19.495) D3(-22.225,1.905) D3(-9.525,19.495) D4(-20.955,1.905) D4(-8.255,19.495) D5(-19.685,1.905) D5(-6.985,19.495) D6(-18.415,1.905) D6(-5.715,19.495) D7(-17.145,1.905) D7(-4.445,19.495) D8(-15.875,1.905) D8(-3.175,19.495) D9(-14.605,1.905) D9(-1.905,19.495) D10(-13.335,1.905) D10(-0.635,19.495) D11(-12.065,1.905) D11(0.635,19.495) D12(-10.795,1.905) D12(1.905,19.495) D13(-9.525,1.905) D13(3.175,19.495) D14(-8.255,1.905) D14(4.445,19.495) D15(-6.985,1.905) D15(5.715,19.495) D16(-5.715,1.905) D16(6.985,19.495) D17(-4.445,1.905) D17(8.255,19.495) D18(-3.175,1.905) D18(9.525,19.495) D19(-1.905,1.905) D19(10.795,19.495) D20(-0.635,1.905) D20(12.065,19.495) D21(0.635,1.905) D22(1.905,1.905) D23(3.175,1.905) D24(4.445,1.905) D25(5.715,1.905) D26(6.985,1.905) D27(8.255,1.905) D28(9.525,1.905) D29(10.795,1.905) D30(12.065,1.905) D31(13.335,1.905) D32(14.605,1.905) D33(15.875,1.905) D34(17.145,1.905) D35(18.415,1.905) D36(19.685,1.905) D37(20.955,1.905) D38(22.225,1.905) D39(23.495,1.905) D40(24.765,1.905) E1(-24.765,0.635) E2(-23.495,0.635) E3(-22.225,0.635) E4(-20.955,0.635) E5(-19.685,0.635) E6(-18.415,0.635) E7(-17.145,0.635) E8(-15.875,0.635) E9(-14.605,0.635) E10(-13.335,0.635) E11(-12.065,0.635) E12(-10.795,0.635) E13(-9.525,0.635) E14(-8.255,0.635) E15(-6.985,0.635) E16(-5.715,0.635) E17(-4.445,0.635) E18(-3.175,0.635) E19(-1.905,0.635) E20(-0.635,0.635) E21(0.635,0.635) E22(1.905,0.635) E23(3.175,0.635) E24(4.445,0.635) E25(5.715,0.635) E26(6.985,0.635) E27(8.255,0.635) E28(9.525,0.635) E29(10.795,0.635) E30(12.065,0.635) E31(13.335,0.635) E32(14.605,0.635) E33(15.875,0.635) E34(17.145,0.635) E35(18.415,0.635) E36(19.685,0.635) E37(20.955,0.635) E38(22.225,0.635) E39(23.495,0.635) E40(24.765,0.635) F1(-24.765,-0.635) F2(-23.495,-0.635) F3(-22.225,-0.635) F4(-20.955,-0.635) F5(-19.685,-0.635) F6(-18.415,-0.635) F7(-17.145,-0.635) F8(-15.875,-0.635) F9(-14.605,-0.635) F10(-13.335,-0.635) F11(-12.065,-0.635) F12(-10.795,-0.635) F13(-9.525,-0.635) F14(-8.255,-0.635) F15(-6.985,-0.635) F16(-5.715,-0.635) F17(-4.445,-0.635) F18(-3.175,-0.635) F19(-1.905,-0.635) F20(-0.635,-0.635) F21(0.635,-0.635) F22(1.905,-0.635) F23(3.175,-0.635) F24(4.445,-0.635) F25(5.715,-0.635) F26(6.985,-0.635) F27(8.255,-0.635) F28(9.525,-0.635) F29(10.795,-0.635) F30(12.065,-0.635) F31(13.335,-0.635) F32(14.605,-0.635) F33(15.875,-0.635) F34(17.145,-0.635) F35(18.415,-0.635) F36(19.685,-0.635) F37(20.955,-0.635) F38(22.225,-0.635) F39(23.495,-0.635) F40(24.765,-0.635) G1(-24.765,-1.905) G2(-23.495,-1.905) G3(-22.225,-1.905) G4(-20.955,-1.905) G5(-19.685,-1.905) G6(-18.415,-1.905) G7(-17.145,-1.905) G8(-15.875,-1.905) G9(-14.605,-1.905) G10(-13.335,-1.905) G11(-12.065,-1.905) G12(-10.795,-1.905) G13(-9.525,-1.905) G14(-8.255,-1.905) G15(-6.985,-1.905) G16(-5.715,-1.905) G17(-4.445,-1.905) G18(-3.175,-1.905) G19(-1.905,-1.905) G20(-0.635,-1.905) G21(0.635,-1.905) G22(1.905,-1.905) G23(3.175,-1.905) G24(4.445,-1.905) G25(5.715,-1.905) G26(6.985,-1.905) G27(8.255,-1.905) G28(9.525,-1.905) G29(10.795,-1.905) G30(12.065,-1.905) G31(13.335,-1.905) G32(14.605,-1.905) G33(15.875,-1.905) G34(17.145,-1.905) G35(18.415,-1.905) G36(19.685,-1.905) G37(20.955,-1.905) G38(22.225,-1.905) G39(23.495,-1.905) G40(24.765,-1.905) H1(-24.765,-3.175) H2(-23.495,-3.175) H3(-22.225,-3.175) H4(-20.955,-3.175) H5(-19.685,-3.175) H6(-18.415,-3.175) H7(-17.145,-3.175) H8(-15.875,-3.175) H9(-14.605,-3.175) H10(-13.335,-3.175) H11(-12.065,-3.175) H12(-10.795,-3.175) H13(-9.525,-3.175) H14(-8.255,-3.175) H15(-6.985,-3.175) H16(-5.715,-3.175) H17(-4.445,-3.175) H18(-3.175,-3.175) H19(-1.905,-3.175) H20(-0.635,-3.175) H21(0.635,-3.175) H22(1.905,-3.175) H23(3.175,-3.175) H24(4.445,-3.175) H25(5.715,-3.175) H26(6.985,-3.175) H27(8.255,-3.175) H28(9.525,-3.175) H29(10.795,-3.175) H30(12.065,-3.175) H31(13.335,-3.175) H32(14.605,-3.175) H33(15.875,-3.175) H34(17.145,-3.175) H35(18.415,-3.175) H36(19.685,-3.175) H37(20.955,-3.175) H38(22.225,-3.175) H39(23.495,-3.175) H40(24.765,-3.175) J1(-24.765,-4.445) J2(-23.495,-4.445) J3(-22.225,-4.445) J4(-20.955,-4.445) J5(-19.685,-4.445) J6(-18.415,-4.445) J7(-17.145,-4.445) J8(-15.875,-4.445) J9(-14.605,-4.445) J10(-13.335,-4.445) J11(-12.065,-4.445) J12(-10.795,-4.445) J13(-9.525,-4.445) J14(-8.255,-4.445) J15(-6.985,-4.445) J16(-5.715,-4.445) J17(-4.445,-4.445) J18(-3.175,-4.445) J19(-1.905,-4.445) J20(-0.635,-4.445) J21(0.635,-4.445) J22(1.905,-4.445) J23(3.175,-4.445) J24(4.445,-4.445) J25(5.715,-4.445) J26(6.985,-4.445) J27(8.255,-4.445) J28(9.525,-4.445) J29(10.795,-4.445) J30(12.065,-4.445) J31(13.335,-4.445) J32(14.605,-4.445) J33(15.875,-4.445) J34(17.145,-4.445) J35(18.415,-4.445) J36(19.685,-4.445) J37(20.955,-4.445) J38(22.225,-4.445) J39(23.495,-4.445) J40(24.765,-4.445) K1(-24.765,-5.715) K2(-23.495,-5.715) K3(-22.225,-5.715) K4(-20.955,-5.715) K5(-19.685,-5.715) K6(-18.415,-5.715) K7(-17.145,-5.715) K8(-15.875,-5.715) K9(-14.605,-5.715) K10(-13.335,-5.715) K11(-12.065,-5.715) K12(-10.795,-5.715) K13(-9.525,-5.715) K14(-8.255,-5.715) K15(-6.985,-5.715) K16(-5.715,-5.715) K17(-4.445,-5.715) K18(-3.175,-5.715) K19(-1.905,-5.715) K20(-0.635,-5.715) K21(0.635,-5.715) K22(1.905,-5.715) K23(3.175,-5.715) K24(4.445,-5.715) K25(5.715,-5.715) K26(6.985,-5.715) K27(8.255,-5.715) K28(9.525,-5.715) K29(10.795,-5.715) K30(12.065,-5.715) K31(13.335,-5.715) K32(14.605,-5.715) K33(15.875,-5.715) K34(17.145,-5.715) K35(18.415,-5.715) K36(19.685,-5.715) K37(20.955,-5.715) K38(22.225,-5.715) K39(23.495,-5.715) K40(24.765,-5.715) L1(-24.765,-6.985) L2(-23.495,-6.985) L3(-22.225,-6.985) L4(-20.955,-6.985) L5(-19.685,-6.985) L6(-18.415,-6.985) L7(-17.145,-6.985) L8(-15.875,-6.985) L9(-14.605,-6.985) L10(-13.335,-6.985) L11(-12.065,-6.985) L12(-10.795,-6.985) L13(-9.525,-6.985) L14(-8.255,-6.985) L15(-6.985,-6.985) L16(-5.715,-6.985) L17(-4.445,-6.985) L18(-3.175,-6.985) L19(-1.905,-6.985) L20(-0.635,-6.985) L21(0.635,-6.985) L22(1.905,-6.985) L23(3.175,-6.985) L24(4.445,-6.985) L25(5.715,-6.985) L26(6.985,-6.985) L27(8.255,-6.985) L28(9.525,-6.985) L29(10.795,-6.985) L30(12.065,-6.985) L31(13.335,-6.985) L32(14.605,-6.985) L33(15.875,-6.985) L34(17.145,-6.985) L35(18.415,-6.985) L36(19.685,-6.985) L37(20.955,-6.985) L38(22.225,-6.985) L39(23.495,-6.985) L40(24.765,-6.985) M1(-24.765,-8.255) M2(-23.495,-8.255) M3(-22.225,-8.255) M4(-20.955,-8.255) M5(-19.685,-8.255) M6(-18.415,-8.255) M7(-17.145,-8.255) M8(-15.875,-8.255) M9(-14.605,-8.255) M10(-13.335,-8.255) M11(-12.065,-8.255) M12(-10.795,-8.255) M13(-9.525,-8.255) M14(-8.255,-8.255) M15(-6.985,-8.255) M16(-5.715,-8.255) M17(-4.445,-8.255) M18(-3.175,-8.255) M19(-1.905,-8.255) M20(-0.635,-8.255) M21(0.635,-8.255) M22(1.905,-8.255) M23(3.175,-8.255) M24(4.445,-8.255) M25(5.715,-8.255) M26(6.985,-8.255) M27(8.255,-8.255) M28(9.525,-8.255) M29(10.795,-8.255) M30(12.065,-8.255) M31(13.335,-8.255) M32(14.605,-8.255) M33(15.875,-8.255) M34(17.145,-8.255) M35(18.415,-8.255) M36(19.685,-8.255) M37(20.955,-8.255) M38(22.225,-8.255) M39(23.495,-8.255) M40(24.765,-8.255) Y1(-24.765,8.255) Y2(-23.495,8.255) Y3(-22.225,8.255) Y4(-20.955,8.255) Y5(-19.685,8.255) Y6(-18.415,8.255) Y7(-17.145,8.255) Y8(-15.875,8.255) Y9(-14.605,8.255) Y10(-13.335,8.255) Y11(-12.065,8.255) Y12(-10.795,8.255) Y13(-9.525,8.255) Y14(-8.255,8.255) Y15(-6.985,8.255) Y16(-5.715,8.255) Y17(-4.445,8.255) Y18(-3.175,8.255) Y19(-1.905,8.255) Y20(-0.635,8.255) Y21(0.635,8.255) Y22(1.905,8.255) Y23(3.175,8.255) Y24(4.445,8.255) Y25(5.715,8.255) Y26(6.985,8.255) Y27(8.255,8.255) Y28(9.525,8.255) Y29(10.795,8.255) Y30(12.065,8.255) Y31(13.335,8.255) Y32(14.605,8.255) Y33(15.875,8.255) Y34(17.145,8.255) Y35(18.415,8.255) Y36(19.685,8.255) Y37(20.955,8.255) Y38(22.225,8.255) Y39(23.495,8.255) Y40(24.765,8.255) Z1(-24.765,6.985) Z2(-23.495,6.985) Z3(-22.225,6.985) Z4(-20.955,6.985) Z5(-19.685,6.985) Z6(-18.415,6.985) Z7(-17.145,6.985) Z8(-15.875,6.985) Z9(-14.605,6.985) Z10(-13.335,6.985) Z11(-12.065,6.985) Z12(-10.795,6.985) Z13(-9.525,6.985) Z14(-8.255,6.985) Z15(-6.985,6.985) Z16(-5.715,6.985) Z17(-4.445,6.985) Z18(-3.175,6.985) Z19(-1.905,6.985) Z20(-0.635,6.985) Z21(0.635,6.985) Z22(1.905,6.985) Z23(3.175,6.985) Z24(4.445,6.985) Z25(5.715,6.985) Z26(6.985,6.985) Z27(8.255,6.985) Z28(9.525,6.985) Z29(10.795,6.985) Z30(12.065,6.985) Z31(13.335,6.985) Z32(14.605,6.985) Z33(15.875,6.985) Z34(17.145,6.985) Z35(18.415,6.985) Z36(19.685,6.985) Z37(20.955,6.985) Z38(22.225,6.985) Z39(23.495,6.985) Z40(24.765,6.985)
  round 5 hole 2.7: SH1(27.55,-56.6)
  round 1.3 hole 1.3 unplated: ""(-27.191,0) ""(-14.491,21.4) ""(14.49,19.394) ""(27.191,-3.048)
via -31.5,-37 diameter 4 hole 2.2
via -30,13.9 diameter 4 hole 2.2
via -15,13.9 diameter 4 hole 2.2
via 0,13.9 diameter 4 hole 2.2
via 15,13.9 diameter 4 hole 2.2
via 15,-59.8 diameter 4 hole 2.2
via 0,-59.8 diameter 4 hole 2.2
via -15,-59.8 diameter 4 hole 2.2
via -29,-56.6 diameter 5 hole 2.7
via -31.5,-2 diameter 5 hole 2.7
via 31.5,-2 diameter 5 hole 2.7
via -31.5,-22 diameter 4 hole 2.2
via 32,-40 diameter 4 hole 2.2
via 32,-22 diameter 4 hole 2.2
via 30,13.9 diameter 4 hole 2.2
Top Layer:
  rectangle: 29.5,-45.3 34.5,16.4
  rectangle: 29.5,-56.1 31.9,-45.3
  rectangle: 24.8,-62.4 29.8,-54.4
  rectangle: -31.5,-62.4 29.8,-57.4
  rectangle: -31.5,-62.4 -29.5,-40.5
  rectangle: -34.5,-40.5 -29.5,16.4
  rectangle: -34.5,11.4 34.5,16.4
Top Overlay:
  lines w0.2: -31.5,-62.4 29.8,-62.4 ; -34.5,10.9 -34.5,16.4 ; -34.5,10.9 34.5,10.9 ; -34.5,10.9 -34.5,-40.5 -32.5,-40.5 cw(c-32.5,-41.5) -31.5,-41.5 -31.5,-67.6 29.8,-67.6 29.8,-57.1 cw(c30.8,-57.1) 30.8,-56.1 31.9,-56.1 31.9,-46.3 cw(c32.9,-46.3) 32.9,-45.3 34.5,-45.3 34.5,10.9 ; -34.5,16.4 34.5,16.4 ; -34.5,16.4 -34.5,26.4 34.5,26.4 34.5,16.4 ; 34.5,10.9 34.5,16.4
Bottom Overlay:
  lines w0.2: -29,-6.7 -34,-6.7 -34,16.2 34,16.2 34,-6.7 29,-6.7 ; -28.9,-0.9 -28,-0.9 -28,-10 28,-10 28,10 -28,10 -28,0.9 -28.9,0.9 -28.9,-0.9 ; -17,20.5 -17,22.3 -15.3,22.3 -15.3,25.1 15.4,25.1 15.4,17.7 -15.3,17.7 -15.3,20.5 -17,20.5
  text "D20" at 13.073,16.617 h0.8
  text "A20" at 13.113,25.496 h0.8
  text "A1" at -11.519,25.496 h0.8
  text "D1" at -11.559,16.617 h0.8
  text "M1" at -24.552,-11.182 h0.8
  text "Y1" at -24.3,10.3 h0.8
  text "M40" at 25.489,-11.156 h0.8
  text "Y40" at 25.7,10.3 h0.8
  text "K" at 29.3,-6.2 h0.8
  text "J" at 29.3,-5 h0.8
  text "E" at 29.3,0.2 h0.8
  text "D" at 29.3,1.5 h0.8
  text "C" at 29.3,2.7 h0.8
  text "B" at 29.3,3.9 h0.8
  text "A" at 29.3,5.2 h0.8
Mechanical 1:
  lines w0.2: -35.5,-67.6 -33.5,-67.6 ; -34.5,-68.6 -34.5,-66.6 ; -1,21.4 1,21.4 ; -1,0 1,0 ; 0,-1 0,1 ; 0,20.4 0,22.4 ; 24.8,-57.4 -29.5,-57.4 -29.5,11.4 29.5,11.4 29.5,-54.4 24.8,-54.4 24.8,-57.3 ; 33.5,-67.7 35.5,-67.7 ; 34.5,-68.7 34.5,-66.7
Mechanical 15:
  lines w0.1: -28.778,-0.762 -27.889,-0.762 -27.889,-9.881 27.889,-9.881 27.889,9.881 -27.889,9.881 -27.889,0.762 -28.778,0.762 -28.778,-0.762 ; -16.79,20.638 -16.79,22.162 -15.189,22.162 -15.189,24.931 15.189,24.931 15.189,17.87 -15.189,17.87 -15.189,20.638 -16.79,20.638
3D body "asp-186900-01_hspce.step": height 6.53, standoff -1.86, extent -16.789,17.869 15.189,24.931
3D body "asp-184330-01.step": height 7.03, standoff -1.35, extent -28.778,-9.881 27.889,9.88